# Altium schematic symbol library IC_ADI.SCHLIB: 3169 symbols (part 42 of 181) (continued)
## AD7245ABR (continued)

## AD7245AQ
designator U?
Single 12-Bit LC2MOS DACPORT, -40 to +85 degC, Q-24-1, Tube; Generic Part Number: AD7245A; PartNumber: AD7245AQ; # DAC Outputs: 1; Max V+: 16.5V; Op Pwr Diss: 210mW; Resolution (Bits): 12; Settling Time: 7祍; Single Supply: Yes; DatasheetVersion: Rev.B; PackageVersion: 100808-A; PackageReference: Q-24-1; PackageDescription: 24-Lead Ceramic Dual In-Line Package [CERDIP]; Supplier Part Number 1: AD7245AQ-ND; Supplier Part Number 2: 66F5838; Supplier Part Number 3: 584-AD7245AQ; Packing: Tube; RoHS: N; Mounting Technology: Through Hole; ComponentLink1Description: Manufacturer URL; ComponentLink2Description: Datasheet; ComponentLink3Description: Package Specification; ComponentLink4Description: Product URL
footprint DIP24 (Footprint not found)
pins: 1 VSS (power) "Negative Supply Voltage (0 V for single supply operation).", 2 ROFS (in) "Bipolar Offset Resistor. This provides access to the on-chip application resistors and allows different output voltage ranges.", 3 REF OUT (out) "Reference Output. The on-chip reference is provided at this pin and is used when configuring the part for bipolar outputs.", 4 AGND (power) "Analog Ground.", 5 DB11 (in) "Data Bit 11. Most Significant Bit (MSB).", 6 DB10 (in) "Data Bit 10", 7 DB9 (in) "Data Bit 9", 8 DB8 (in) "Data Bit 8", 9 DB7 (in) "Data Bit 7", 10 DB6 (in) "Data Bit 6", 11 DB5 (in) "Data Bit 5", 12 DGND (power) "Digital Ground.", 13 DB4 (in) "Data Bit 4", 14 DB3 (in) "Data Bit 3", 15 DB2 (in) "Data Bit 2", 16 DB1 (in) "Data Bit 1", 17 DB0 (in) "Data Bit 0. Least Significant Bit (LSB).", 18 ~{CS} (in) "Chip Select Input (Active LOW). The device is selected when this input is active.", 19 ~{WR} (in) "Write Input (Active LOW). This is used in conjunction with C\S\ to write data into the input latch of the AD7245A.", 20 ~{LDAC} (in) "Load DAC Input (Active LOW). This is an asynchronous input which when active transfers data from the input latch to the DAC latch.", 21 ~{CLR} (in) "Clear Input (Active LOW). When this input is active the contents of the DAC latch are reset to all 0s.", 22 VDD (power) "Positive Supply Voltage.", 23 RFB (in) "Feedback Resistor. This allows access to the amplifier抯 feedback loop.", 24 VOUT (out) "Output Voltage. Three different output voltage ranges can be chosen: 0 V to 5 V, 0 V to 10 V or -5 V to +5 V."

## AD7245ATQ
designator U?
Single 12-Bit LC2MOS DACPORT, -55 to +125 degC, Q-24-1, Tube; Generic Part Number: AD7245A; PartNumber: AD7245ATQ; # DAC Outputs: 1; Max V+: 16.5V; Op Pwr Diss: 210mW; Resolution (Bits): 12; Settling Time: 7祍; Single Supply: Yes; DatasheetVersion: Rev.B; PackageVersion: 100808-A; PackageReference: Q-24-1; PackageDescription: 24-Lead Ceramic Dual In-Line Package [CERDIP]; Supplier Part Number 1: AD7245ATQ-ND; Supplier Part Number 2: 584-AD7245ATQ; Packing: Tube; RoHS: N; Mounting Technology: Through Hole; ComponentLink1Description: Manufacturer URL; ComponentLink2Description: Datasheet; ComponentLink3Description: Package Specification; ComponentLink4Description: Product URL
footprint DIP24 (Footprint not found)
pins: 1 VSS (power) "Negative Supply Voltage (0 V for single supply operation).", 2 ROFS (in) "Bipolar Offset Resistor. This provides access to the on-chip application resistors and allows different output voltage ranges.", 3 REF OUT (out) "Reference Output. The on-chip reference is provided at this pin and is used when configuring the part for bipolar outputs.", 4 AGND (power) "Analog Ground.", 5 DB11 (in) "Data Bit 11. Most Significant Bit (MSB).", 6 DB10 (in) "Data Bit 10", 7 DB9 (in) "Data Bit 9", 8 DB8 (in) "Data Bit 8", 9 DB7 (in) "Data Bit 7", 10 DB6 (in) "Data Bit 6", 11 DB5 (in) "Data Bit 5", 12 DGND (power) "Digital Ground.", 13 DB4 (in) "Data Bit 4", 14 DB3 (in) "Data Bit 3", 15 DB2 (in) "Data Bit 2", 16 DB1 (in) "Data Bit 1", 17 DB0 (in) "Data Bit 0. Least Significant Bit (LSB).", 18 ~{CS} (in) "Chip Select Input (Active LOW). The device is selected when this input is active.", 19 ~{WR} (in) "Write Input (Active LOW). This is used in conjunction with C\S\ to write data into the input latch of the AD7245A.", 20 ~{LDAC} (in) "Load DAC Input (Active LOW). This is an asynchronous input which when active transfers data from the input latch to the DAC latch.", 21 ~{CLR} (in) "Clear Input (Active LOW). When this input is active the contents of the DAC latch are reset to all 0s.", 22 VDD (power) "Positive Supply Voltage.", 23 RFB (in) "Feedback Resistor. This allows access to the amplifier抯 feedback loop.", 24 VOUT (out) "Output Voltage. Three different output voltage ranges can be chosen: 0 V to 5 V, 0 V to 10 V or -5 V to +5 V."

## AD7247AAN
designator U?
Dual 12-Bit LC2MOS DACPORT, -40 to +85 degC, N-24-1, Tube; Generic Part Number: AD7247A; PartNumber: AD7247AAN; # DAC Outputs: 2; Max V+: 15V; Resolution (Bits): 12; DatasheetVersion: Rev.A; PackageVersion: 071006-A; PackageReference: N-24-1; PackageDescription: 24-Lead Plastic Dual In-Line Package [PDIP] Narrow Body; Supplier Part Number 1: AD7247AAN-ND; Supplier Part Number 2: 584-AD7247AAN; Packing: Tube; RoHS: N; Mounting Technology: Through Hole; Code_JEDEC: MS-001; ComponentLink1Description: Manufacturer URL; ComponentLink2Description: Datasheet; ComponentLink3Description: Package Specification; ComponentLink4Description: Product URL
footprint DIP24 (Footprint not found)
pins: 1 REF OUT (out) "Voltage Reference Output.The internal 5 V analog reference is provided at this pin.To operate the part with internal reference;REF OUT should be connected to REF IN.", 2 ROFSB (in) "Output Offset Resistor for DAC B.This input configures the output ranges for DAC B.It is connected to VOUTB for the + 5 V range,to GND for the + 10 V range and to REF IN for the +/- 5 V range.", 3 VOUTB (out) "Analog Output Voltage from DAC B.This is the buffer amplifier output voltage.Three different output voltage ranges can be chosen:0 to + 5 V,0 to + 10 V and +/- 5 V.The amplifier is capable of developing + 10 V across a 2 (See Datasheet)", 4 DB11 (in) "Data Bit 11 (MSB).", 5 DB10 (in) "Data Bit 10.", 6 GND (power) "Ground.Ground reference for all on-chip circuitry.", 7 DB9 (in) "Data Bit 9.", 8 DB8 (in) "Data Bit 8.", 9 DB7 (in) "Data Bit 7.", 10 DB6 (in) "Data Bit 6.", 11 DB5 (in) "Data Bit 5.", 12 DB4 (in) "Data Bit 4.", 13 DB3 (in) "Data Bit 3.", 14 DB2 (in) "Data Bit 2.", 15 DB1 (in) "Data Bit 1.", 16 DB0 (in) "Data Bit 0 (LSB).", 17 ~{CSB} (in) "Chip Select Input for DAC B.Active low logic input.DAC B is selected when this input is active.", 18 ~{CSA} (in) "Chip Select Input for DAC A.Active low logic input.DAC A is selected when this input is active.", 19 ~{WR} (in) "Write Input.W\R\ is an active low logic input which is used in conjunction with C\S\A\ and C\S\B\ to write data to the DAC latches.", 20 VDD (power) "Positive Supply,+ 15 V.", 21 VOUTA (out) "Analog Output Voltage from DAC A.This is the buffer amplifier output voltage.Three different output voltage ranges can be chosen:0 to + 5 V,0 to + 10 V and +/- 5 V.The amplifier is capable of developing + 10 V across a 2 (See Datasheet)", 22 VSS (power) "Negative Supply,- 15 V.", 23 ROFSA (in) "Output Offset Resistor for DAC A.This input configures the output ranges for DAC A.It is connected to VOUTA for the + 5 V range,to GND for the + 10 V range and to REF IN for the +/- 5 V range.", 24 REF IN (in) "Voltage Reference Input.The common reference voltage for both DACs is applied to this pin.It is internally buffered before being applied to both DACs.The nominal reference voltage for correct operation of the AD7247 is 5 V."

## AD7247AAR
designator U?
Dual 12-Bit LC2MOS DACPORT, -40 to +85 degC, RW-24, Tube; Generic Part Number: AD7247A; PartNumber: AD7247AAR; # DAC Outputs: 2; Max V+: 15V; Resolution (Bits): 12; Settling Time: 10us; DatasheetVersion: Rev.A; PackageVersion: 060706-A; PackageReference: RW-24; PackageDescription: 24-Lead Standard Small Outline Package [SOIC_W]; Supplier Part Number 1: AD7247AAR-ND; Supplier Part Number 2: 584-AD7247AAR; Packing: Tube; RoHS: N; Mounting Technology: Surface Mount; Code_JEDEC: MS-013-AD; ComponentLink1Description: Manufacturer URL; ComponentLink2Description: Datasheet; ComponentLink3Description: Package Specification; ComponentLink4Description: Product URL
footprint SOIC24W_1.27 (Footprint not found)
pins: 1 REF OUT (out) "Voltage Reference Output. The internal 5 V analog reference is provided at this pin. To operate the part with internal reference, REF OUT should be connected to REF IN.", 2 ROFSB (in) "Output Offset Resistor for DAC B. This input configures the output ranges for DAC B. It is connected to VOUTB for the +5 V range, to GND for the +10 V range and to REF IN for the +/-5 V range.", 3 VOUTB (out) "Analog Output Voltage from DAC B. This is the buffer amplifier output voltage. Three different Output voltage ranges can be chosen: 0 to +5 V, 0 to +10 V and +/-5 V. The amplifier is capable of developing +10 V across a 2 (See Datasheet)", 4 DB11 (in) "Data Bit 11 (MSB).", 5 DB10 (in) "Data Bit 10.", 6 GND (power) "Ground. Ground reference for all on-chip circuitry.", 7 DB9 (in) "Data Bit 9.", 8 DB8 (in) "Data Bit 8.", 9 DB7 (in) "Data Bit 7.", 10 DB6 (in) "Data Bit 6.", 11 DB5 (in) "Data Bit 5.", 12 DB4 (in) "Data Bit 4.", 13 DB3 (in) "Data Bit 3.", 14 DB2 (in) "Data Bit 2.", 15 DB1 (in) "Data Bit 1.", 16 DB0 (in) "Data Bit 0 (LSB).", 17 ~{CSB} (in) "Chip Select Input for DAC B. Active low logic input. DAC B is selected when this input is active.", 18 ~{CSA} (in) "Chip Select Input for DAC A. Active low logic input. DAC A is selected when this input is active.", 19 ~{WR} (in) "Write Input. W\R\ is an active low logic input which is used in conjunction with C\S\A\ and C\S\B\ to write data to the DAC latches.", 20 VDD (power) "Positive Suppiy, +15V.", 21 VOUTA (out) "Analog Output Voltage from DAC A. This is the buffer amplifier output voltage. Three different Output voltage ranges can be chosen: 0 to +5 V , 0 to +10 V and +/-5 V. The amplifier is capable of developing +10 V across a 2 (See Datasheet)", 22 VSS (power) "Negative Supply,-15V.", 23 ROFSA (in) "Output Offset Resistor for DAC A. This input configures the output ranges for DAC A. It is connected to VOUTB for the +5 V range, to GND for the +10 V range and to REF IN for the +/-5 V range.", 24 REF IN (in) "Voltage Reference Input. The common reference voltage for both DACs is applied to this pin. It is internally buffered before being appiled to both DACs. The nominal reference voltage for correct operation of the AD7247 is 5 (See Datasheet)"

## AD7247AARZ
designator U?
Dual 12-Bit LC2MOS DACPORT, -40 to +85 degC, RW-24, Pb-Free, Tube; Generic Part Number: AD7247A; PartNumber: AD7247AARZ; # DAC Outputs: 2; Max V+: 15V; Resolution (Bits): 12; Settling Time: 10us; DatasheetVersion: Rev.A; PackageVersion: 060706-A; PackageReference: RW-24; PackageDescription: 24-Lead Standard Small Outline Package [SOIC_W]; Supplier Part Number 1: AD7247AARZ-ND; Supplier Part Number 2: 59K4623; Supplier Part Number 3: 584-AD7247AARZ; Packing: Tube; RoHS: Y; Mounting Technology: Surface Mount; Code_JEDEC: MS-013-AD; ComponentLink1Description: Manufacturer URL; ComponentLink2Description: Datasheet; ComponentLink3Description: Package Specification; ComponentLink4Description: Product URL
footprint SOIC24W_1.27 (Footprint not found)
pins: 1 REF OUT (out) "Voltage Reference Output. The internal 5 V analog reference is provided at this pin. To operate the part with internal reference, REF OUT should be connected to REF IN.", 2 ROFSB (in) "Output Offset Resistor for DAC B. This input configures the output ranges for DAC B. It is connected to VOUTB for the +5 V range, to GND for the +10 V range and to REF IN for the +/-5 V range.", 3 VOUTB (out) "Analog Output Voltage from DAC B. This is the buffer amplifier output voltage. Three different Output voltage ranges can be chosen: 0 to +5 V, 0 to +10 V and +/-5 V. The amplifier is capable of developing +10 V across a 2 (See Datasheet)", 4 DB11 (in) "Data Bit 11 (MSB).", 5 DB10 (in) "Data Bit 10.", 6 GND (power) "Ground. Ground reference for all on-chip circuitry.", 7 DB9 (in) "Data Bit 9.", 8 DB8 (in) "Data Bit 8.", 9 DB7 (in) "Data Bit 7.", 10 DB6 (in) "Data Bit 6.", 11 DB5 (in) "Data Bit 5.", 12 DB4 (in) "Data Bit 4.", 13 DB3 (in) "Data Bit 3.", 14 DB2 (in) "Data Bit 2.", 15 DB1 (in) "Data Bit 1.", 16 DB0 (in) "Data Bit 0 (LSB).", 17 ~{CSB} (in) "Chip Select Input for DAC B. Active low logic input. DAC B is selected when this input is active.", 18 ~{CSA} (in) "Chip Select Input for DAC A. Active low logic input. DAC A is selected when this input is active.", 19 ~{WR} (in) "Write Input. W\R\ is an active low logic input which is used in conjunction with C\S\A\ and C\S\B\ to write data to the DAC latches.", 20 VDD (power) "Positive Suppiy, +15V.", 21 VOUTA (out) "Analog Output Voltage from DAC A. This is the buffer amplifier output voltage. Three different Output voltage ranges can be chosen: 0 to +5 V , 0 to +10 V and +/-5 V. The amplifier is capable of developing +10 V across a 2 (See Datasheet)", 22 VSS (power) "Negative Supply,-15V.", 23 ROFSA (in) "Output Offset Resistor for DAC A. This input configures the output ranges for DAC A. It is connected to VOUTB for the +5 V range, to GND for the +10 V range and to REF IN for the +/-5 V range.", 24 REF IN (in) "Voltage Reference Input. The common reference voltage for both DACs is applied to this pin. It is internally buffered before being appiled to both DACs. The nominal reference voltage for correct operation of the AD7247 is 5 (See Datasheet)"

## AD7247ABN
designator U?
Dual 12-Bit LC2MOS DACPORT, -40 to +85 degC, N-24-1, Tube; Generic Part Number: AD7247A; PartNumber: AD7247ABN; # DAC Outputs: 2; Max V+: 15V; Resolution (Bits): 12; Settling Time: 30 ns; Single Supply: YES; DatasheetVersion: Rev.A; PackageVersion: 071006-A; PackageReference: N-24-1; PackageDescription: 24-Lead Plastic Dual In-Line Package [PDIP] Narrow Body; Supplier Part Number 1: AD7247ABN-ND; Supplier Part Number 2: 584-AD7247ABN; Packing: Tube; RoHS: N; Mounting Technology: Through Hole; Code_JEDEC: MS-001; ComponentLink1Description: Manufacturer URL; ComponentLink2Description: Datasheet; ComponentLink3Description: Package Specification; ComponentLink4Description: Product URL
footprint DIP24 (Footprint not found)
pins: 1 REF OUT (out) "Voltage Reference Output.The internal 5 V analog reference is provided at this pin.To operate the part with internal reference;REF OUT should be connected to REF IN.", 2 ROFSB (in) "Output Offset Resistor for DAC B.This input configures the output ranges for DAC B.It is connected to VOUTB for the + 5 V range,to GND for the + 10 V range and to REF IN for the +/- 5 V range.", 3 VOUTB (out) "Analog Output Voltage from DAC B.This is the buffer amplifier output voltage.Three different output voltage ranges can be chosen:0 to + 5 V,0 to + 10 V and +/- 5 V.The amplifier is capable of developing + 10 V across a 2 (See Datasheet)", 4 DB11 (in) "Data Bit 11 (MSB).", 5 DB10 (in) "Data Bit 10.", 6 GND (power) "Ground.Ground reference for all on-chip circuitry.", 7 DB9 (in) "Data Bit 9.", 8 DB8 (in) "Data Bit 8.", 9 DB7 (in) "Data Bit 7.", 10 DB6 (in) "Data Bit 6.", 11 DB5 (in) "Data Bit 5.", 12 DB4 (in) "Data Bit 4.", 13 DB3 (in) "Data Bit 3.", 14 DB2 (in) "Data Bit 2.", 15 DB1 (in) "Data Bit 1.", 16 DB0 (in) "Data Bit 0 (LSB).", 17 ~{CSB} (in) "Chip Select Input for DAC B.Active low logic input.DAC B is selected when this input is active.", 18 ~{CSA} (in) "Chip Select Input for DAC A.Active low logic input.DAC A is selected when this input is active.", 19 ~{WR} (in) "Write Input.W\R\ is an active low logic input which is used in conjunction with C\S\A\ and C\S\B\ to write data to the DAC latches.", 20 VDD (power) "Positive Supply,+ 15 V.", 21 VOUTA (out) "Analog Output Voltage from DAC A.This is the buffer amplifier output voltage.Three different output voltage ranges can be chosen:0 to + 5 V,0 to + 10 V and +/- 5 V.The amplifier is capable of developing + 10 V across a 2 (See Datasheet)", 22 VSS (power) "Negative Supply,- 15 V.", 23 ROFSA (in) "Output Offset Resistor for DAC A.This input configures the output ranges for DAC A.It is connected to VOUTA for the + 5 V range,to GND for the + 10 V range and to REF IN for the +/- 5 V range.", 24 REF IN (in) "Voltage Reference Input.The common reference voltage for both DACs is applied to this pin.It is internally buffered before being applied to both DACs.The nominal reference voltage for correct operation of the AD7247 is 5 V."

## AD7247ABR
designator U?
Dual 12-Bit LC2MOS DACPORT, -40 to +85 degC, RW-24, Tube; Generic Part Number: AD7247A; PartNumber: AD7247ABR; # DAC Outputs: 2; Max V+: 15V; Resolution (Bits): 12; Settling Time: 30 ns; Single Supply: YES; DatasheetVersion: Rev.A; PackageVersion: 060706-A; PackageReference: RW-24; PackageDescription: 24-Lead Standard Small Outline Package [SOIC_W]; Supplier Part Number 1: AD7247ABR-ND; Supplier Part Number 2: 584-AD7247ABR; Packing: Tube; RoHS: N; Mounting Technology: Surface Mount; Code_JEDEC: MS-013-AD; ComponentLink1Description: Manufacturer URL; ComponentLink2Description: Datasheet; ComponentLink3Description: Package Specification; ComponentLink4Description: Product URL
footprint SOIC24W_1.27 (Footprint not found)
pins: 1 REF OUT (out) "Voltage Reference Output. The internal 5 V analog reference is provided at this pin. To operate the part with internal reference, REF OUT should be connected to REF IN.", 2 ROFSB (in) "Output Offset Resistor for DAC B. This input configures the output ranges for DAC B. It is connected to VOUTB for the +5 V range, to GND for the +10 V range and to REF IN for the +/-5 V range.", 3 VOUTB (out) "Analog Output Voltage from DAC B. This is the buffer amplifier output voltage. Three different Output voltage ranges can be chosen: 0 to +5 V, 0 to +10 V and +/-5 V. The amplifier is capable of developing +10 V across a 2 (See Datasheet)", 4 DB11 (in) "Data Bit 11 (MSB).", 5 DB10 (in) "Data Bit 10.", 6 GND (power) "Ground. Ground reference for all on-chip circuitry.", 7 DB9 (in) "Data Bit 9.", 8 DB8 (in) "Data Bit 8.", 9 DB7 (in) "Data Bit 7.", 10 DB6 (in) "Data Bit 6.", 11 DB5 (in) "Data Bit 5.", 12 DB4 (in) "Data Bit 4.", 13 DB3 (in) "Data Bit 3.", 14 DB2 (in) "Data Bit 2.", 15 DB1 (in) "Data Bit 1.", 16 DB0 (in) "Data Bit 0 (LSB).", 17 ~{CSB} (in) "Chip Select Input for DAC B. Active low logic input. DAC B is selected when this input is active.", 18 ~{CSA} (in) "Chip Select Input for DAC A. Active low logic input. DAC A is selected when this input is active.", 19 ~{WR} (in) "Write Input. W\R\ is an active low logic input which is used in conjunction with C\S\A\ and C\S\B\ to write data to the DAC latches.", 20 VDD (power) "Positive Suppiy, +15V.", 21 VOUTA (out) "Analog Output Voltage from DAC A. This is the buffer amplifier output voltage. Three different Output voltage ranges can be chosen: 0 to +5 V , 0 to +10 V and +/-5 V. The amplifier is capable of developing +10 V across a 2 (See Datasheet)", 22 VSS (power) "Negative Supply,-15V.", 23 ROFSA (in) "Output Offset Resistor for DAC A. This input configures the output ranges for DAC A. It is connected to VOUTB for the +5 V range, to GND for the +10 V range and to REF IN for the +/-5 V range.", 24 REF IN (in) "Voltage Reference Input. The common reference voltage for both DACs is applied to this pin. It is internally buffered before being appiled to both DACs. The nominal reference voltage for correct operation of the AD7247 is 5 (See Datasheet)"

## AD7247AQ
designator U?
Dual 12-Bit LC2MOS DACPORT, -40 to +85 degC, Q-24-1, Tube; Generic Part Number: AD7247A; PartNumber: AD7247AQ; # DAC Outputs: 2; Max V+: 15V; Resolution (Bits): 12; Settling Time: 30 ns; Single Supply: YES; DatasheetVersion: Rev.A; PackageVersion: 100808-A; PackageReference: Q-24-1; PackageDescription: 24-Lead Ceramic Dual In-Line Package [CERDIP]; Supplier Part Number 1: AD7247AQ-ND; Supplier Part Number 2: 584-AD7247AQ; Packing: Tube; RoHS: N; Mounting Technology: Through Hole; ComponentLink1Description: Manufacturer URL; ComponentLink2Description: Datasheet; ComponentLink3Description: Package Specification; ComponentLink4Description: Product URL
footprint DIP24 (Footprint not found)
pins: 1 REF OUT (out) "Voltage Reference Output. The internal 5 V analog reference is provided at this pin. To operate the part with internal reference, REF OUT should be connected to REF IN.", 2 ROFSB (in) "Output Offset Resistor for DAC B. This input configures the output ranges for DAC B. It is connected to VOUTB for the +5 V range, to GND for the +10 V range and to REF IN for the +/-5 V range.", 3 VOUTB (out) "Analog Output Voltage from DAC B. This is the buffer amplifier output voltage. Three different Output voltage ranges can be chosen: 0 to +5 V r, 0 to +10 V and +/-5 V. The amplifier is capable of developing +10 V across a 2 (See Datasheet)", 4 DB11 (in) "Data Bit 11 (MSB).", 5 DB10 (in) "Data Bit 10.", 6 GND (power) "Ground. Ground reference for all on-chip circuitry.", 7 DB9 (in) "Data Bit 9.", 8 DB8 (in) "Data Bit 8.", 9 DB7 (in) "Data Bit 7.", 10 DB6 (in) "Data Bit 6.", 11 DB5 (in) "Data Bit 5.", 12 DB4 (in) "Data Bit 4.", 13 DB3 (in) "Data Bit 3.", 14 DB2 (in) "Data Bit 2.", 15 DB1 (in) "Data Bit 1.", 16 DB0 (in) "Data Bit 0 (LSB).", 17 ~{CSB} (in) "Chip Select Input for DAC B. Active low logic input. DAC B is selected when this input is active.", 18 ~{CSA} (in) "Chip Select Input for DAC A. Active low logic input. DAC A is selected when this input is active.", 19 ~{WR} (in) "Write Input. W\R\ is an active low logic input which is used in conjunction with C\S\A\ and C\S\B\ to write data to the DAC latches.", 20 VDD (power) "Positive Supply, +15V.", 21 VOUTA (out) "Analog Output Voltage from DAC A. This is the buffer amplifier output voltage. Three different Output voltage ranges can be chosen: 0 to +5 V , 0 to +10 V and +/-5 V. The amplifier is capable of developing +10 V across a 2 (See Datasheet)", 22 VSS (power) "Negative Supply,-15V.", 23 ROFSA (in) "Output Offset Resistor for DAC A. This input configures the output ranges for DAC A. It is connected to VOUTB for the +5 V range, to GND for the +10 V range and to REF IN for the +/-5 V range.", 24 REF IN (in) "Voltage Reference Input. The common reference voltage for both DACs is applied to this pin. It is internally buffered before being appiled to both DACs. The nominal reference voltage for correct operation of the AD7247 is 5 (See Datasheet)"

## AD7247ATQ
designator U?
Dual 12-Bit LC2MOS DACPORT, -55 to+125 degC, Q-24-1, Tube; Generic Part Number: AD7247A; PartNumber: AD7247ATQ; # DAC Outputs: 2; Max V+: 15V; Op Pwr Diss: 165mW; Resolution (Bits): 12; Single Supply: Yes; DatasheetVersion: Rev.A; PackageVersion: 100808-A; PackageReference: Q-24-1; PackageDescription: 24-Lead Ceramic Dual In-Line Package [CERDIP]; Supplier Part Number 1: AD7247ATQ-ND; Supplier Part Number 2: 584-AD7247ATQ; Packing: Tube; RoHS: N; Mounting Technology: Through Hole; ComponentLink1Description: Manufacturer URL; ComponentLink2Description: Datasheet; ComponentLink3Description: Package Specification; ComponentLink4Description: Product URL
footprint DIP24 (Footprint not found)
pins: 1 REF OUT (out) "Voltage Reference Output. The internal 5 V analog reference is provided at this pin. To operate the part with internal reference, REF OUT should be connected to REF IN.", 2 ROFSB (in) "Output Offset Resistor for DAC B. This input configures the output ranges for DAC B. It is connected to VOUTB for the +5 V range, to GND for the +10 V range and to REF IN for the +/-5 V range.", 3 VOUTB (out) "Analog Output Voltage from DAC B. This is the buffer amplifier output voltage. Three different Output voltage ranges can be chosen: 0 to +5 V r, 0 to +10 V and +/-5 V. The amplifier is capable of developing +10 V across a 2 (See Datasheet)", 4 DB11 (in) "Data Bit 11 (MSB).", 5 DB10 (in) "Data Bit 10.", 6 GND (power) "Ground. Ground reference for all on-chip circuitry.", 7 DB9 (in) "Data Bit 9.", 8 DB8 (in) "Data Bit 8.", 9 DB7 (in) "Data Bit 7.", 10 DB6 (in) "Data Bit 6.", 11 DB5 (in) "Data Bit 5.", 12 DB4 (in) "Data Bit 4.", 13 DB3 (in) "Data Bit 3.", 14 DB2 (in) "Data Bit 2.", 15 DB1 (in) "Data Bit 1.", 16 DB0 (in) "Data Bit 0 (LSB).", 17 ~{CSB} (in) "Chip Select Input for DAC B. Active low logic input. DAC B is selected when this input is active.", 18 ~{CSA} (in) "Chip Select Input for DAC A. Active low logic input. DAC A is selected when this input is active.", 19 ~{WR} (in) "Write Input. W\R\ is an active low logic input which is used in conjunction with C\S\A\ and C\S\B\ to write data to the DAC latches.", 20 VDD (power) "Positive Supply, +15V.", 21 VOUTA (out) "Analog Output Voltage from DAC A. This is the buffer amplifier output voltage. Three different Output voltage ranges can be chosen: 0 to +5 V , 0 to +10 V and +/-5 V. The amplifier is capable of developing +10 V across a 2 (See Datasheet)", 22 VSS (power) "Negative Supply,-15V.", 23 ROFSA (in) "Output Offset Resistor for DAC A. This input configures the output ranges for DAC A. It is connected to VOUTB for the +5 V range, to GND for the +10 V range and to REF IN for the +/-5 V range.", 24 REF IN (in) "Voltage Reference Input. The common reference voltage for both DACs is applied to this pin. It is internally buffered before being appiled to both DACs. The nominal reference voltage for correct operation of the AD7247 is 5 (See Datasheet)"

## AD7248AAN
designator U?
Single 12-Bit LC2MOS DACPORT, -40 to +85 degC, N-20, Tube; Generic Part Number: AD7248A; PartNumber: AD7248AAN; # DAC Outputs: 1; Max V+: +16.5V; Resolution (Bits): 12; Settling Time: 7祍; Single Supply: Yes; DatasheetVersion: Rev.B; PackageVersion: 070706-A; PackageReference: N-20; PackageDescription: 20-Lead Plastic Dual In-Line Package [PDIP] Narrow Body; Supplier Part Number 1: AD7248AAN-ND; Supplier Part Number 2: 584-AD7248AAN; Packing: Tube; RoHS: N; Mounting Technology: Through Hole; Code_JEDEC: MS-001; ComponentLink1Description: Manufacturer URL; ComponentLink2Description: Datasheet; ComponentLink3Description: Package Specification; ComponentLink4Description: Product URL
footprint DIP20 (Footprint not found)
pins: 1 VSS (power) "Negative Supply Voltage (0 V for single supply operation).", 2 ROFS (in) "Bipolar Offset Resistor. This provides access to the on-chip application resistors and allows different output voltage ranges.", 3 REF OUT (out) "Reference Output. The on-chip reference is provided at this pin and is used when configuring the part for bipolar outputs.", 4 AGND (power) "Analog Ground.", 5 DB7 (in) "Data Bit 7.", 6 DB6 (in) "Data Bit 6.", 7 DB5 (in) "Data Bit 5.", 8 DB4 (in) "Data Bit 4.", 9 DB3 (in) "Data Bit 3.", 10 DGND (power) "Digital Ground.", 11 DB2 (in) "Data Bit 2/Data Bit 10.", 12 DB1 (in) "Data Bit 1/Data Bit 9.", 13 DB0 (in) "Data Bit 0 (LSB)/Data Bit 8.", 14 ~{CSMSB} (in) "Chip Select Input for MS Nibble. (Active LOW). This selects the upper 4 bits of the input latch. Input data is right justified.", 15 ~{CSLSB} (in) "Chip Select Input for LS byte. (Active LOW). This selects the lower 8 bits of the input latch.", 16 ~{WR} (in) "Write Input. This is used in conjunction with C\S\M\S\B\ and C\S\L\S\B\ to load data into the input latch of the AD7248A.", 17 ~{LDAC} (in) "Load DAC Input (Active LOW). This is an asynchronous input which when active transfers data from the input latch to the DAC latch.", 18 VDD (power) "Positive Supply Voltage.", 19 RFB (in) "Feedback Resistor. This allows access to the amplifier’s feedback loop.", 20 VOUT (out) "Output Voltage. Three different output voltage ranges can be chosen: 0 V to 5 V, 0 V to 10 V or -5 V to +5 V."

## AD7248AAP
designator U?
Single 12-Bit LC2MOS DACPORT, -40 to +85 degC, P-20A, Tube; Generic Part Number: AD7248A; PartNumber: AD7248AAP; # DAC Outputs: 1; Max V+: +16.5V; Resolution (Bits): 12; Settling Time: 7祍; Single Supply: Yes; DatasheetVersion: Rev.B; PackageVersion: Nov-2002; PackageReference: P-20A; PackageDescription: 20-Lead Plastic Leaded Chip Carrier [PLCC]; Supplier Part Number 1: AD7248AAP-ND; Supplier Part Number 2: 584-AD7248AAP; Packing: Tube; RoHS: N; Mounting Technology: Surface Mount; Code_JEDEC: MO-047-AA; ComponentLink1Description: Manufacturer URL; ComponentLink2Description: Datasheet; ComponentLink3Description: Package Specification; ComponentLink4Description: Product URL
footprint PLCC-20N (Footprint not found)
pins: 1 VSS (power) "Negative Supply Voltage (0 V for single supply operation).", 2 ROFS (in) "Bipolar Offset Resistor. This provides access to the on-chip application resistors and allows different output voltage ranges.", 3 REF OUT (out) "Reference Output. The on-chip reference is provided at this pin and is used when configuring the part for bipolar outputs.", 4 AGND (power) "Analog Ground.", 5 DB7 (in) "Data Bit 7.", 6 DB6 (in) "Data Bit 6.", 7 DB5 (in) "Data Bit 5.", 8 DB4 (in) "Data Bit 4.", 9 DB3 (in) "Data Bit 3.", 10 DGND (power) "Digital Ground.", 11 DB2 (in) "Data Bit 2/Data Bit 10.", 12 DB1 (in) "Data Bit 1/Data Bit 9.", 13 DB0 (in) "Data Bit 0 (LSB)/Data Bit 8.", 14 ~{CSMSB} (in) "Chip Select Input for MS Nibble. (Active LOW). This selects the upper 4 bits of the input latch. Input data is right justified.", 15 ~{CSLSB} (in) "Chip Select Input for LS byte. (Active LOW). This selects the lower 8 bits of the input latch.", 16 ~{WR} (in) "Write Input. This is used in conjunction with C\S\M\S\B\ and C\S\L\S\B\ to load data into the input latch of the AD7248A.", 17 ~{LDAC} (in) "Load DAC Input (Active LOW). This is an asynchronous input which when active transfers data from the input latch to the DAC latch.", 18 VDD (power) "Positive Supply Voltage.", 19 RFB (in) "Feedback Resistor. This allows access to the amplifier抯 feedback loop.", 20 VOUT (out) "Output Voltage. Three different output voltage ranges can be chosen: 0 V to 5 V, 0 V to 10 V or -5 V to +5 V."

## AD7248AAPZ
designator U?
Single 12-Bit LC2MOS DACPORT, -40 to +85 degC, P-20A, Pb-Free, Tube; Generic Part Number: AD7248A; PartNumber: AD7248AAPZ; # DAC Outputs: 1; Max V+: +16.5V; Resolution (Bits): 12; Settling Time: 7祍; Single Supply: Yes; DatasheetVersion: Rev.B; PackageVersion: Nov-2002; PackageReference: P-20A; PackageDescription: 20-Lead Plastic Leaded Chip Carrier [PLCC]; Supplier Part Number 1: AD7248AAPZ-ND; Supplier Part Number 2: 59K4633; Supplier Part Number 3: 584-AD7248AAPZ; Packing: Tube; RoHS: Y; Mounting Technology: Surface Mount; Code_JEDEC: MO-047-AA; ComponentLink1Description: Manufacturer URL; ComponentLink2Description: Datasheet; ComponentLink3Description: Package Specification; ComponentLink4Description: Product URL
footprint PLCC-20N (Footprint not found)
pins: 1 VSS (power) "Negative Supply Voltage (0 V for single supply operation).", 2 ROFS (in) "Bipolar Offset Resistor. This provides access to the on-chip application resistors and allows different output voltage ranges.", 3 REF OUT (out) "Reference Output. The on-chip reference is provided at this pin and is used when configuring the part for bipolar outputs.", 4 AGND (power) "Analog Ground.", 5 DB7 (in) "Data Bit 7.", 6 DB6 (in) "Data Bit 6.", 7 DB5 (in) "Data Bit 5.", 8 DB4 (in) "Data Bit 4.", 9 DB3 (in) "Data Bit 3.", 10 DGND (power) "Digital Ground.", 11 DB2 (in) "Data Bit 2/Data Bit 10.", 12 DB1 (in) "Data Bit 1/Data Bit 9.", 13 DB0 (in) "Data Bit 0 (LSB)/Data Bit 8.", 14 ~{CSMSB} (in) "Chip Select Input for MS Nibble. (Active LOW). This selects the upper 4 bits of the input latch. Input data is right justified.", 15 ~{CSLSB} (in) "Chip Select Input for LS byte. (Active LOW). This selects the lower 8 bits of the input latch.", 16 ~{WR} (in) "Write Input. This is used in conjunction with C\S\M\S\B\ and C\S\L\S\B\ to load data into the input latch of the AD7248A.", 17 ~{LDAC} (in) "Load DAC Input (Active LOW). This is an asynchronous input which when active transfers data from the input latch to the DAC latch.", 18 VDD (power) "Positive Supply Voltage.", 19 RFB (in) "Feedback Resistor. This allows access to the amplifier抯 feedback loop.", 20 VOUT (out) "Output Voltage. Three different output voltage ranges can be chosen: 0 V to 5 V, 0 V to 10 V or -5 V to +5 V."